# Altium footprint library Potentiometer.PcbLib: 55 footprints (part 1 of 4)
Each footprint in its own frame and in the unit in brackets; x right, y up, seen from the top. Pads: shape width x height; smd on the part's side, far side on the other; paste and mask are expansions set on the pad; w line width, h text height; cw(c..) or ccw(c..) is an arc to the next point about the centre after c.
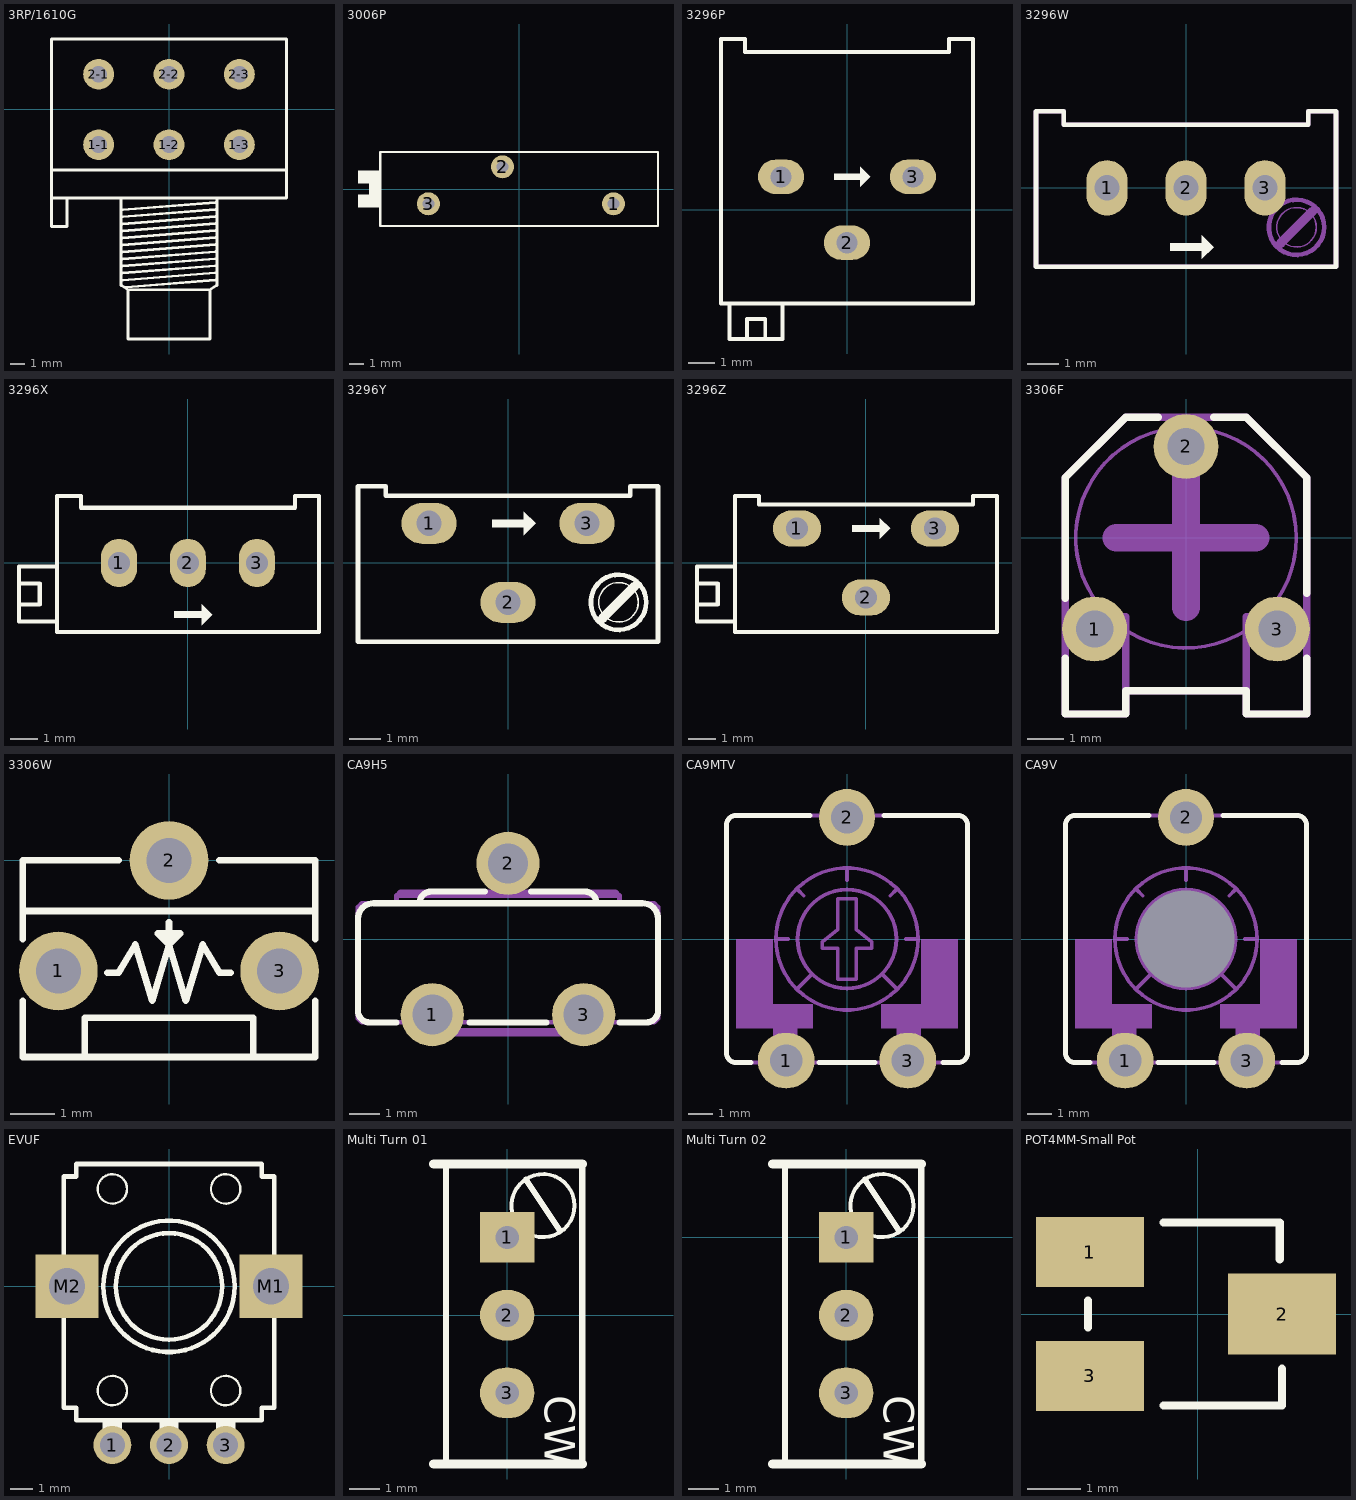
[diagram p0: the footprints below, top view; thin cyan lines are the x and y axes]

## 3RP/1610G [mm]
pads (6):
  round 2.184 hole 1.2: 1-1(-5,-2.5) 1-2(0,-2.5) 1-3(5,-2.5) 2-1(-5,2.5) 2-2(0,2.5) 2-3(5,2.5)
Top Overlay:
  lines w0.203: -8.35,-4.3 8.35,-4.3 ; -7.25,-6.4 -7.25,-8.3 -8.35,-8.3 -8.35,-6.3 ; -3.4,-6.4 -3.4,-12.5 -2.9,-12.8 ; -3.3,-12.125 3.3,-11.6 ; -3.3,-11.625 3.3,-11.1 ; -3.3,-11.125 3.3,-10.6 ; -3.3,-10.625 3.3,-10.1 ; -3.3,-10.125 3.3,-9.6 ; -3.3,-9.625 3.3,-9.1 ; -3.3,-9.125 3.3,-8.6 ; -3.3,-8.625 3.3,-8.1 ; -3.3,-8.125 3.3,-7.6 ; -3.3,-7.625 3.3,-7.1 ; -3.3,-7.125 3.3,-6.6 ; -3.075,-12.625 3.3,-12.1 ; 3.4,-6.4 3.4,-12.5 2.9,-12.8 ; -8.35,-6.3 -8.35,5 8.35,5 8.35,-6.3 -8.35,-6.3 ; -2.9,-12.8 2.9,-12.8 ; -2.9,-12.8 -2.9,-16.3 2.9,-16.3 2.9,-12.8
3D body "SW3dPS-ALPHA-potentiometer stereo PCB mount.STEP": height 21.2, standoff -3.3, extent -8.5,-36.033 8.5,4.817

## 3006P [mil]
pads (3):
  round 62 hole 32: 1(255,-40) 2(-45,60) 3(-245,-40)
Top Overlay:
  rectangle: -435,-50 -400,-15
  rectangle: -435,15 -400,50
  rectangle: -405,-50 -375,50
  lines w6: -375,-100 -375,100 375,100 375,-100 -375,-100
3D body "SW3dPS-bourns_3006p.STEP": height 250.98, standoff -204.02, extent -435,-95 375,95

## 3296P [mil]
pads (3):
  oval 70x52 hole 32: 1(-100,50) 2(0,-50) 3(100,50)
Top Overlay:
  rectangle: -20,45 20,55
  region: 20,65 20,35 35,50
  lines w6: -178,-142 -178,-196 -98,-196 -98,-142 ; -152,-196 -152,-166 -124,-166 -124,-196 ; -191,-142 -191,259 -155,259 -155,239 155,239 155,259 191,259 191,-142 -191,-142
3D body "SW3dPS-bourns 3296P pot.STEP": height 173.27, standoff -342.13, extent -187.6,-198.73 187.59,255.99

## 3296W [mil]
pads (3):
  oval 52x70 hole 32: 1(-100,0) 2(0,0) 3(100,0)
Top Overlay:
  rectangle: -20,-80 20,-70
  region: 20,-60 20,-90 35,-75
  lines w6: -190,-100 190,-100 190,97 155,97 155,80 -155,80 -155,97 -190,97 -190,-100
Mechanical 1:
  circle w2: c140,-50 r25
  circle w6: c140,-50 r35
  lines w6: -190,-100 -190,97 -155,97 -155,80 155,80 155,97 190,97 190,-100 -190,-100
  lines w12: 120,-70 160,-30
3D body "SW3dPS-bourns 3296W pot.STEP": height 454.72, standoff -251.97, extent -187.19,-96 188,94.2

## 3296X [mil]
pads (3):
  oval 52x70 hole 32: 1(-100,0) 2(0,0) 3(100,0)
Top Overlay:
  rectangle: -20,-80 20,-70
  region: 20,-60 20,-90 35,-75
  lines w6: -245,-60 -215,-60 -215,-30 -245,-30 ; -190,-85 -245,-85 -245,-5 -190,-5 ; -190,-100 190,-100 190,97 155,97 155,80 -155,80 -155,97 -190,97 -190,-100
3D body "SW3dPS-bourns 3296X pot.STEP": height 394.88, standoff -251.97, extent -247.44,-95 187.6,95.2

## 3296Y [mil]
pads (3):
  oval 70x52 hole 32: 1(-100,50) 2(0,-50) 3(100,50)
Top Overlay:
  circle w6: c140,-50 r35
  circle w2: c140,-50 r25
  rectangle: -20,45 20,55
  region: 20,65 20,35 35,50
  lines w6: -190,-100 -190,97 -155,97 -155,85 155,85 155,97 190,97 190,-100 -190,-100
  lines w12: 120,-70 160,-30
3D body "SW3dPS-bourns 3296Y pot.STEP": height 454.72, standoff -251.97, extent -187.59,-95 187.6,95.2

## 3296Z [mil]
pads (3):
  oval 70x52 hole 32: 1(-100,50) 2(0,-50) 3(100,50)
Top Overlay:
  rectangle: -20,45 20,55
  region: 20,65 20,35 35,50
  lines w6: -245,-60 -215,-60 -215,-30 -245,-30 ; -190,-85 -245,-85 -245,-5 -190,-5 ; -190,-100 190,-100 190,97 155,97 155,85 -155,85 -155,97 -190,97 -190,-100
3D body "SW3dPS-bourns 3296Z pot.STEP": height 394.88, standoff -251.97, extent -247.44,-95 187.6,95.2

## 3306F [mil]
pads (3):
  round 70 hole 40: 1(-98.43,-98.43) 2(0,98.43) 3(98.43,-98.43)
Top Overlay:
  lines w8: -130,-130 -130,-190 -65,-190 -65,-165 65,-165 65,-190 130,-190 130,-130 ; -130,-65 -130,65 -65,130 -30,130 ; 30,130 65,130 130,65 130,-60
Mechanical 1:
  circle w3.94: c0,0 r118.85
  lines w8: -130,-60 -130,-85 -65,-85 -65,-165 ; 130,-60 130,-85 65,-85 65,-165 ; -65,-165 65,-165 ; -65,-165 -65,-190 -130,-190 -130,65 -65,130 65,130 130,65 130,-190 65,-190 65,-165
  lines w30: -75,0 75,0 ; 0,-75 0,75
3D body "User Library-Trimmer, 3306F-1.STEP": height 300, standoff -119.49, extent -134.05,-191.98 134.06,132.89

## 3306W [mil]
pads (3):
  round 70 hole 40: 1(-98.43,-98.43) 2(0,0) 3(98.43,-98.43)
Top Overlay:
  lines w6: -130,-125 -130,-175 130,-175 130,-125 ; -130,-70 -130,0 -45,0 ; -130,-45 130,-45 ; -75,-175 -75,-140 75,-140 75,-175 ; -55,-100 -45,-100 -30,-75 -15,-125 0,-75 ; 45,0 130,0 130,-70 ; 55,-100 45,-100 30,-75 15,-125 0,-75 ; 0,-75 0,-55 0,-75 ; 0,-75 10,-65 -10,-65 0,-75
3D body "User Library-POT-3306W.STEP": height 330.71, standoff -75, extent -134.05,-177.16 134.06,5.91

## CA9H5 [mil]
pads (3):
  round 82 hole 52: 1(-98.43,-98.43) 2(0,98.43) 3(98.43,-98.43)
Top Overlay:
  lines w8: -145,-108.43 -180,-108.43 cw(c-180,-93.43) -195,-93.43 -195,26.57 cw(c-175,26.57) -175,46.57 -170,46.57 175,46.57 cw(c175,26.57) 195,26.57 195,-93.43 cw(c180,-93.43) 180,-108.43 145,-108.43 ; -115,46.57 cw(c-100,46.57) -100,61.57 -30,61.57 ; -50,-108.43 50,-108.43 ; 30,61.57 100,61.57 cw(c100,46.57) 115,46.57
Mechanical 1:
  lines w6: -145,46.57 -145,56.57 ; -145,46.57 -190,46.57 -195,41.57 -195,-103.43 -190,-108.43 -160,-108.43 -100,-108.43 ; -145,46.57 145,46.57 ; -145,56.57 -140,61.57 140,61.57 145,56.57 ; -145,56.57 145,56.57 ; -100,-118.43 -95,-123.43 -40,-123.43 40,-123.43 95,-123.43 100,-118.43 ; -100,-118.43 -100,-108.43 ; -100,-118.43 -40,-118.43 40,-118.43 100,-118.43 ; -100,-108.43 -40,-108.43 40,-108.43 100,-108.43 ; 100,-118.43 100,-108.43 ; 100,-108.43 160,-108.43 190,-108.43 195,-103.43 195,41.57 190,46.57 145,46.57 ; 145,46.57 145,56.57
3D body "SW3dPS-Trimpot Vertical.STEP": height 475.63, standoff -126.73, extent -193.85,-121.42 199.86,101.02

## CA9MTV [mil]
pads (3):
  oval 92x90 hole 52: 1(-98.43,-196.85) 3(98.43,-196.85)
  oval 90x92 hole 52: 2(0,196.85)
Top Overlay:
  lines w8: -155,-200 -180,-200 cw(c-180,-185) -195,-185 -195,185 cw(c-180,185) -180,200 -60,200 ; -45,-200 45,-200 ; 60,200 180,200 cw(c180,185) 195,185 195,-185 cw(c180,-185) 180,-200 155,-200
Mechanical 1:
  circle w6: c0,0 r115
  circle w6: c0,0 r80
  rectangle: -120,-215 -80,-145
  rectangle: -180,-145 -55,-105
  rectangle: -180,-105 -120,0
  rectangle: 120,-105 180,0
  rectangle: 55,-145 180,-105
  rectangle: 80,-215 120,-145
  rectangle: -20,200 20,215
  lines w6: -115,0 -95,0 ; -80,-80 -60,-60 ; -80,80 -70,70 ; 0,95 0,115 ; 60,-60 80,-80 ; 70,70 80,80 ; 95,0 115,0 ; -195,-185 ccw(c-180,-185) -180,-200 -155,-200 -45,-200 45,-200 155,-200 180,-200 ccw(c180,-185) 195,-185 195,185 ccw(c180,185) 180,200 60,200 -60,200 -180,200 ccw(c-180,185) -195,185 -195,-185 ; -40,-15 -40,-5 -15,15 -15,65 15,65 15,15 40,-5 40,-15 15,-15 15,-65 -15,-65 -15,-15 -40,-15
3D body "SW3dPS-Trimpot Horizontal.STEP": height 251.97, standoff -133.86, extent -196.84,-198.57 196.86,203

## CA9V [mil]
pads (4):
  oval 92x90 hole 52: 1(-98.43,-196.85) 3(98.43,-196.85)
  oval 90x92 hole 52: 2(0,196.85)
  round 0 hole 157.48: MH(0,0)
Top Overlay:
  lines w8: -155,-200 -180,-200 cw(c-180,-185) -195,-185 -195,185 cw(c-180,185) -180,200 -60,200 ; -45,-200 45,-200 ; 60,200 180,200 cw(c180,185) 195,185 195,-185 cw(c180,-185) 180,-200 155,-200
Mechanical 1:
  circle w6: c0,0 r115
  circle w6: c0,0 r80
  rectangle: -120,-215 -80,-145
  rectangle: -180,-145 -55,-105
  rectangle: -180,-105 -120,0
  rectangle: 120,-105 180,0
  rectangle: 55,-145 180,-105
  rectangle: 80,-215 120,-145
  rectangle: -20,200 20,215
  lines w6: -115,0 -95,0 ; -80,-80 -60,-60 ; -80,80 -70,70 ; 0,95 0,115 ; 60,-60 80,-80 ; 70,70 80,80 ; 95,0 115,0 ; -195,-185 ccw(c-180,-185) -180,-200 -155,-200 -45,-200 45,-200 155,-200 180,-200 ccw(c180,-185) 195,-185 195,185 ccw(c180,185) 180,200 60,200 -60,200 -180,200 ccw(c-180,185) -195,185 -195,-185 ; -40,-15 -40,-5 -15,15 -15,65 15,65 15,15 40,-5 40,-15 15,-15 15,-65 -15,-65 -15,-15 -40,-15
3D body "SW3dPS-Trimpot Horizontal.STEP": height 251.97, standoff -133.86, extent -196.84,-198.57 196.86,203

## EVUF [mm]
pads (5):
  round 1.676 hole 1.1: 1(-2.5,-7) 2(0,-7) 3(2.5,-7)
  rect 2.8x2.8 hole 1.6: M1(4.5,0) M2(-4.5,0)
Top Overlay:
  circle w0.203: c0,0 r2.35
  circle w0.203: c0,0 r2.9
  circle w0.102: c2.5,4.3 r0.65
  circle w0.102: c-2.5,4.3 r0.65
  circle w0.102: c2.5,-4.6 r0.65
  circle w0.102: c-2.5,-4.6 r0.65
  rectangle: 2.075,-7.325 2.925,-6
  rectangle: -0.425,-7.325 0.425,-6
  rectangle: -2.925,-7.325 -2.075,-6
  lines w0.203: -4.75,-0.9 -5.5,-0.9 -5.5,0.9 -4.75,0.9 ; -4.65,-2.15 -4.65,-5.35 ; -4.65,2.65 -4.65,4.85 ; 4.65,-2.15 4.65,-5.35 ; 4.65,2.65 4.65,4.85 ; 4.75,-0.9 5.5,-0.9 5.5,0.9 4.75,0.9 ; -4.65,-5.35 -4.1,-5.35 -4.1,-5.9 4.1,-5.9 4.1,-5.35 4.65,-5.35 ; -4.65,-5.35 -4.65,4.85 ; -4.65,4.85 -4.1,4.85 -4.1,5.4 4.1,5.4 4.1,4.85 4.65,4.85 ; 4.65,-5.35 4.65,4.85
Mechanical 1:
  lines w0.008: -5.3,-1.05 -3.7,-1.05 -3.7,1.05 -5.3,1.05 -5.3,-1.05 ; 3.7,-1.05 5.3,-1.05 5.3,1.05 3.7,1.05 3.7,-1.05
3D body "SW3dPS-Potentiometer 250U.STEP": height 15.26, standoff -3.8, extent -4.876,-7.21 4.876,5.341

## Multi Turn 01 [mil] "Stand Multi Turn - Turning CW Increase P1~2 Resistor"
height 472.44
pads (3):
  rect 70x65 hole 30: 1(0,100)
  oval 70x65 hole 30: 2(0,0) 3(0,-100)
Top Overlay:
  circle w5: c46.03,140.94 r40.58
  lines w7.87: -78.74,-191.34 -78.74,194.49 ; 24.02,174.41 67.72,108.66 ; 96.46,-191.34 96.46,194.49
  lines w11.81: -94.49,-191.34 96.46,-191.34 ; -94.49,194.49 96.46,194.49
  text "CW" at 48,-103 h39.37
3D body "multiturn.STEP": height 452.18, standoff -75.38, extent -73.75,-182.01 92,192

## Multi Turn 02 [mil]
pads (3):
  rect 70x65 hole 30: 1(0,0)
  oval 70x65 hole 30: 2(0,-100) 3(0,-200)
Top Overlay:
  circle w5: c46.03,40.94 r40.58
  lines w7.87: -78.74,-291.34 -78.74,94.49 ; 24.02,74.41 67.72,8.66 ; 96.46,-291.34 96.46,94.49
  lines w11.81: -94.49,-291.34 96.46,-291.34 ; -94.49,94.49 96.46,94.49
  text "CW" at 48,-203 h39.37
3D body "multiturn.STEP": height 452.18, standoff -75.38, extent -73.23,-285.04 92.52,88.97

## POT4MM-Small Pot [mm] "Square Trimming Potentiometer"
pads (3):
  rect 2x1.3 smd: 1(-2,1.15) 3(-2,-1.15)
  rect 2x1.5 smd: 2(1.568,0)
Top Overlay:
  lines w0.15: -2.032,-0.254 -2.032,0.254 ; -0.635,-1.7 1.568,-1.7 1.568,-1.016 ; -0.635,1.7 1.524,1.7 1.524,1.016
3D body "TRIMMER_PVG3A.STEP": height 2, standoff 0, extent -2.032,-1.7 1.568,1.7